# Altium footprint library PCB_ConnectorHDR.PcbLib: 119 footprints (part 6 of 8)
Each footprint in its own frame and in the unit in brackets; x right, y up, seen from the top. Pads: shape width x height; smd on the part's side, far side on the other; paste and mask are expansions set on the pad; w line width, h text height; cw(c..) or ccw(c..) is an arc to the next point about the centre after c.
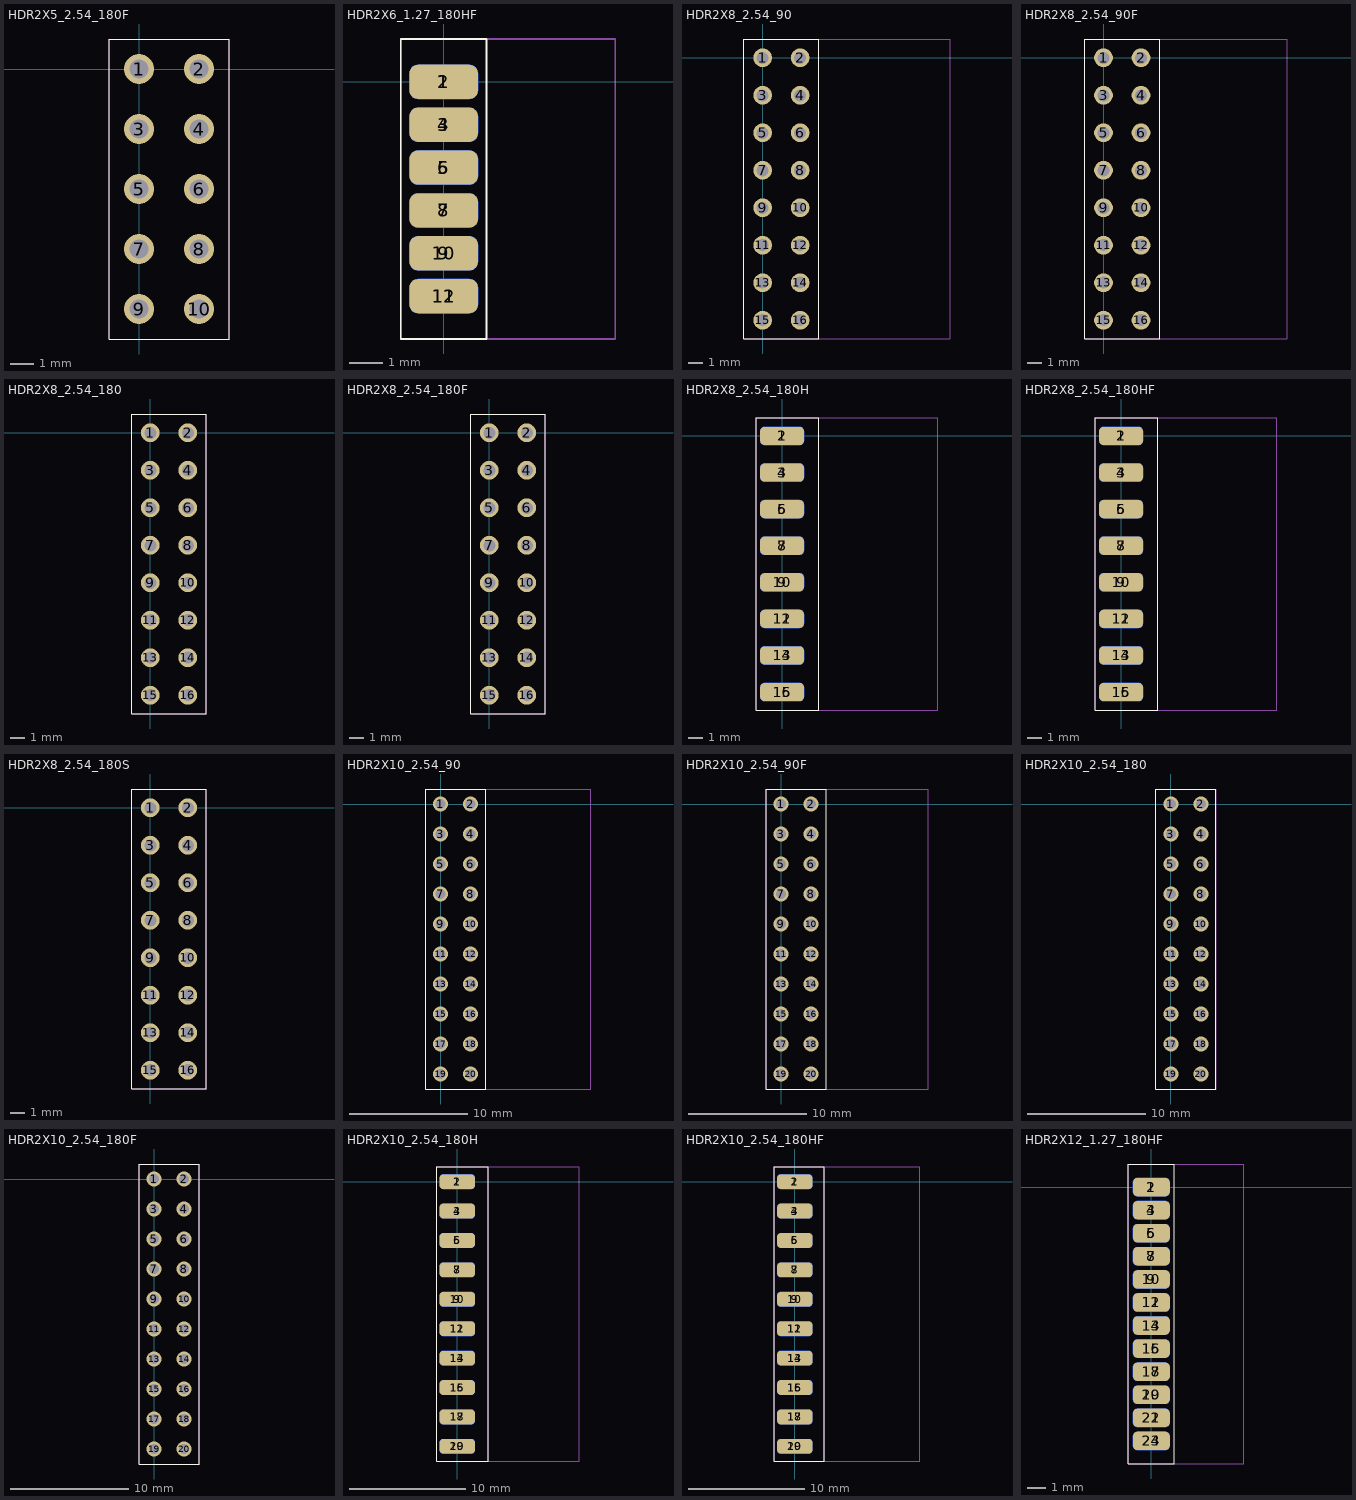
[diagram p5: the footprints below, top view; thin cyan lines are the x and y axes]

## HDR2X5_2.54_180F [mil]
height 169.29
pads (10):
  round 50 hole 32: 1(0,0) 2(100,0) 3(0,-100) 4(100,-100) 5(0,-200) 6(100,-200) 7(0,-300) 8(100,-300) 9(0,-400) 10(100,-400)
Top Overlay:
  lines w2: -50,-450 -50,50 150,50 150,-450 -50,-450
Mechanical 13:
  lines w2: -50,-450 -50,50 150,50 150,-450 -50,-450
3D body "female_header_a-bl254-dg-g10d.stp": height 334.65, standoff -125.98, extent -48.43,-454.92 148.42,54.92

## HDR2X6_1.27_180HF [mil]
height 169.29
pads (12):
  rrect50% 80x40 smd: 1(0,0) 3(0,-50) 5(0,-100) 7(0,-150) 9(0,-200) 11(0,-250)
  rrect50% 80x40 smd far side: 2(0,0) 4(0,-50) 6(0,-100) 8(0,-150) 10(0,-200) 12(0,-250)
Top Overlay:
  lines w2: -50,-300 50,-300 50,50 -50,50 -50,-300
Mechanical 13:
  lines w2: -50,-300 200,-300 200,50 -50,50 -50,-300
3D body "female_header_a-bl127-dg-g12d.stp": height 39.02, standoff -83.02, extent -28.35,-282.88 200,32.88

## HDR2X8_2.54_90 [mil]
height 169.29
pads (16):
  round 50 hole 32: 1(0,0) 2(100,0) 3(0,-100) 4(100,-100) 5(0,-200) 6(100,-200) 7(0,-300) 8(100,-300) 9(0,-400) 10(100,-400) 11(0,-500) 12(100,-500) 13(0,-600) 14(100,-600) 15(0,-700) 16(100,-700)
Top Overlay:
  lines w2: -50,-750 -50,50 150,50 150,-750 -50,-750
Mechanical 13:
  lines w2: -50,-750 -50,50 500,50 500,-750 -50,-750
3D body "pin_header_awl254-da-g16d.stp": height 198.43, standoff -116.54, extent -10,-750 497.09,50

## HDR2X8_2.54_90F [mil]
height 169.29
pads (16):
  round 50 hole 32: 1(0,0) 2(100,0) 3(0,-100) 4(100,-100) 5(0,-200) 6(100,-200) 7(0,-300) 8(100,-300) 9(0,-400) 10(100,-400) 11(0,-500) 12(100,-500) 13(0,-600) 14(100,-600) 15(0,-700) 16(100,-700)
Top Overlay:
  lines w2: -50,-750 -50,50 150,50 150,-750 -50,-750
Mechanical 13:
  lines w2: -50,-750 -50,50 490,50 490,-750 -50,-750
3D body "female_header_a-bl254-da-g16d.stp": height 198.43, standoff -124.41, extent -10,-754.92 486.06,54.92

## HDR2X8_2.54_180 [mil]
height 169.29
pads (16):
  round 50 hole 32: 1(0,0) 2(100,0) 3(0,-100) 4(100,-100) 5(0,-200) 6(100,-200) 7(0,-300) 8(100,-300) 9(0,-400) 10(100,-400) 11(0,-500) 12(100,-500) 13(0,-600) 14(100,-600) 15(0,-700) 16(100,-700)
Top Overlay:
  lines w2: -50,-750 -50,50 150,50 150,-750 -50,-750
Mechanical 13:
  lines w2: -50,-750 -50,50 150,50 150,-750 -50,-750
3D body "pin_header_awl254-dg-g16d.stp": height 334.65, standoff -118.11, extent -50,-749.99 150,50.01

## HDR2X8_2.54_180F [mil]
height 169.29
pads (16):
  round 50 hole 32: 1(0,0) 2(100,0) 3(0,-100) 4(100,-100) 5(0,-200) 6(100,-200) 7(0,-300) 8(100,-300) 9(0,-400) 10(100,-400) 11(0,-500) 12(100,-500) 13(0,-600) 14(100,-600) 15(0,-700) 16(100,-700)
Top Overlay:
  lines w2: -50,-750 -50,50 150,50 150,-750 -50,-750
Mechanical 13:
  lines w2: -50,-750 -50,50 150,50 150,-750 -50,-750
3D body "female_header_a-bl254-dg-g16d.stp": height 334.65, standoff -125.98, extent -48.42,-754.92 148.43,54.93

## HDR2X8_2.54_180H [mil]
height 169.29
pads (16):
  rrect50% 120x50 smd: 1(0,0) 3(0,-100) 5(0,-200) 7(0,-300) 9(0,-400) 11(0,-500) 13(0,-600) 15(0,-700)
  rrect50% 120x50 smd far side: 2(0,0) 4(0,-100) 6(0,-200) 8(0,-300) 10(0,-400) 12(0,-500) 14(0,-600) 16(0,-700)
Top Overlay:
  lines w2: -70,-750 -70,50 100,50 100,-750 -70,-750
Mechanical 13:
  lines w2: -70,-750 425,-750 425,50 -70,50 -70,-750
T-Component:
  lines w2: -70,-750 -70,50 100,50 100,-750 -70,-750
3D body "pin_header_awl254-dg-g16d.stp": height 78, standoff -122, extent -38.11,-749.99 414.65,50.01

## HDR2X8_2.54_180HF [mil]
height 169.29
pads (16):
  rrect50% 120x50 smd: 1(0,0) 3(0,-100) 5(0,-200) 7(0,-300) 9(0,-400) 11(0,-500) 13(0,-600) 15(0,-700)
  rrect50% 120x50 smd far side: 2(0,0) 4(0,-100) 6(0,-200) 8(0,-300) 10(0,-400) 12(0,-500) 14(0,-600) 16(0,-700)
Top Overlay:
  lines w2: -70,-750 100,-750 100,50 -70,50 -70,-750
Mechanical 13:
  lines w2: -70,-750 -70,50 425,50 425,-750 -70,-750
T-Component:
  lines w2: -70,-750 100,-750 100,50 -70,50 -70,-750
3D body "female_header_a-bl254-dg-g16d.stp": height 76.43, standoff -120.43, extent -35.98,-754.92 424.65,54.92

## HDR2X8_2.54_180S [mil]
height 169.29
pads (16):
  round 50 hole 32: 1(0,0) 2(100,0) 3(0,-100) 4(100,-100) 5(0,-200) 6(100,-200) 7(0,-300) 8(100,-300) 9(0,-400) 10(100,-400) 11(0,-500) 12(100,-500) 13(0,-600) 14(100,-600) 15(0,-700) 16(100,-700)
Top Overlay:
  lines w2: -50,-750 150,-750 150,50 -50,50 -50,-750
Mechanical 13:
  lines w2: -50,-750 150,-750 150,50 -50,50 -50,-750
3D body "pin_header_a-sl254-dg-g16mp1.stp": height 334.71, standoff -48.82, extent -97.64,-750 197.64,50

## HDR2X10_2.54_90 [mil]
height 169.29
pads (20):
  round 50 hole 32: 1(0,0) 2(100,0) 3(0,-100) 4(100,-100) 5(0,-200) 6(100,-200) 7(0,-300) 8(100,-300) 9(0,-400) 10(100,-400) 11(0,-500) 12(100,-500) 13(0,-600) 14(100,-600) 15(0,-700) 16(100,-700) 17(0,-800) 18(100,-800) 19(0,-900) 20(100,-900)
Top Overlay:
  lines w2: -50,-950 -50,50 150,50 150,-950 -50,-950
Mechanical 13:
  lines w2: -50,-950 500,-950 500,50 -50,50 -50,-950
3D body "pin_header_awl254-da-g20d.stp": height 198.43, standoff -116.54, extent -12.44,-950 494.65,50

## HDR2X10_2.54_90F [mil]
height 169.29
pads (20):
  round 50 hole 32: 1(0,0) 2(100,0) 3(0,-100) 4(100,-100) 5(0,-200) 6(100,-200) 7(0,-300) 8(100,-300) 9(0,-400) 10(100,-400) 11(0,-500) 12(100,-500) 13(0,-600) 14(100,-600) 15(0,-700) 16(100,-700) 17(0,-800) 18(100,-800) 19(0,-900) 20(100,-900)
Top Overlay:
  lines w2: -50,-950 -50,50 150,50 150,-950 -50,-950
Mechanical 13:
  lines w2: -50,-950 -50,50 490,50 490,-950 -50,-950
3D body "female_header_a-bl254-da-g20d.stp": height 198.43, standoff -124.41, extent -10,-954.92 486.06,54.92

## HDR2X10_2.54_180 [mil]
height 169.29
pads (20):
  round 50 hole 32: 1(0,0) 2(100,0) 3(0,-100) 4(100,-100) 5(0,-200) 6(100,-200) 7(0,-300) 8(100,-300) 9(0,-400) 10(100,-400) 11(0,-500) 12(100,-500) 13(0,-600) 14(100,-600) 15(0,-700) 16(100,-700) 17(0,-800) 18(100,-800) 19(0,-900) 20(100,-900)
Top Overlay:
  lines w2: -50,-950 150,-950 150,50 -50,50 -50,-950
Mechanical 13:
  lines w2: -50,-950 150,-950 150,50 -50,50 -50,-950
3D body "pin_header_awl254-dg-g20d.stp": height 334.65, standoff -118.11, extent -50,-950 150,50

## HDR2X10_2.54_180F [mil]
height 169.29
pads (20):
  round 50 hole 32: 1(0,0) 2(100,0) 3(0,-100) 4(100,-100) 5(0,-200) 6(100,-200) 7(0,-300) 8(100,-300) 9(0,-400) 10(100,-400) 11(0,-500) 12(100,-500) 13(0,-600) 14(100,-600) 15(0,-700) 16(100,-700) 17(0,-800) 18(100,-800) 19(0,-900) 20(100,-900)
Top Overlay:
  lines w2: -50,-950 150,-950 150,50 -50,50 -50,-950
Mechanical 13:
  lines w2: -50,-950 150,-950 150,50 -50,50 -50,-950
3D body "female_header_a-bl254-dg-g20d.stp": height 334.65, standoff -125.98, extent -48.42,-954.92 148.43,54.92

## HDR2X10_2.54_180H [mil]
height 169.29
pads (20):
  rrect50% 120x50 smd: 1(0,0) 3(0,-100) 5(0,-200) 7(0,-300) 9(0,-400) 11(0,-500) 13(0,-600) 15(0,-700) 17(0,-800) 19(0,-900)
  rrect50% 120x50 smd far side: 2(0,0) 4(0,-100) 6(0,-200) 8(0,-300) 10(0,-400) 12(0,-500) 14(0,-600) 16(0,-700) 18(0,-800) 20(0,-900)
Top Overlay:
  lines w2: -70,-950 -70,50 105,50 105,-950 -70,-950
Mechanical 13:
  lines w2: -70,-950 415,-950 415,50 -70,50 -70,-950
T-Component:
  lines w2: -70,-950 105,-950 105,50 -70,50 -70,-950
3D body "pin_header_awl254-dg-g20d.stp": height 100, standoff -100, extent -37.76,-950 415,50

## HDR2X10_2.54_180HF [mil]
height 169.29
pads (20):
  rrect50% 120x50 smd: 1(0,0) 3(0,-100) 5(0,-200) 7(0,-300) 9(0,-400) 11(0,-500) 13(0,-600) 15(0,-700) 17(0,-800) 19(0,-900)
  rrect50% 120x50 smd far side: 2(0,0) 4(0,-100) 6(0,-200) 8(0,-300) 10(0,-400) 12(0,-500) 14(0,-600) 16(0,-700) 18(0,-800) 20(0,-900)
Top Overlay:
  lines w2: -70,-950 -70,50 100,50 100,-950 -70,-950
Mechanical 13:
  lines w2: -70,-950 425,-950 425,50 -70,50 -70,-950
T-Component:
  lines w2: -70,-950 100,-950 100,50 -70,50 -70,-950
3D body "female_header_a-bl254-dg-g20d.stp": height 76.43, standoff -120.43, extent -40.98,-954.92 419.65,54.92

## HDR2X12_1.27_180HF [mil]
height 169.29
pads (24):
  rrect50% 80x40 smd: 1(0,0) 3(0,-50) 5(0,-100) 7(0,-150) 9(0,-200) 11(0,-250) 13(0,-300) 15(0,-350) 17(0,-400) 19(0,-450) 21(0,-500) 23(0,-550)
  rrect50% 80x40 smd far side: 2(0,0) 4(0,-50) 6(0,-100) 8(0,-150) 10(0,-200) 12(0,-250) 14(0,-300) 16(0,-350) 18(0,-400) 20(0,-450) 22(0,-500) 24(0,-550)
Top Overlay:
  lines w2: -50,-600 -50,50 50,50 50,-600 -50,-600
Mechanical 13:
  lines w2: -50,-600 -50,50 200,50 200,-600 -50,-600
3D body "female_header_a-bl127-dg-g24d.stp": height 39.02, standoff -83.02, extent -28.34,-582.88 200,32.87